# Altium footprint library my Library.PcbLib: 1247 footprints (part 44 of 78)
Each footprint in its own frame and in the unit in brackets; x right, y up, seen from the top. Pads: shape width x height; smd on the part's side, far side on the other; paste and mask are expansions set on the pad; w line width, h text height; cw(c..) or ccw(c..) is an arc to the next point about the centre after c.
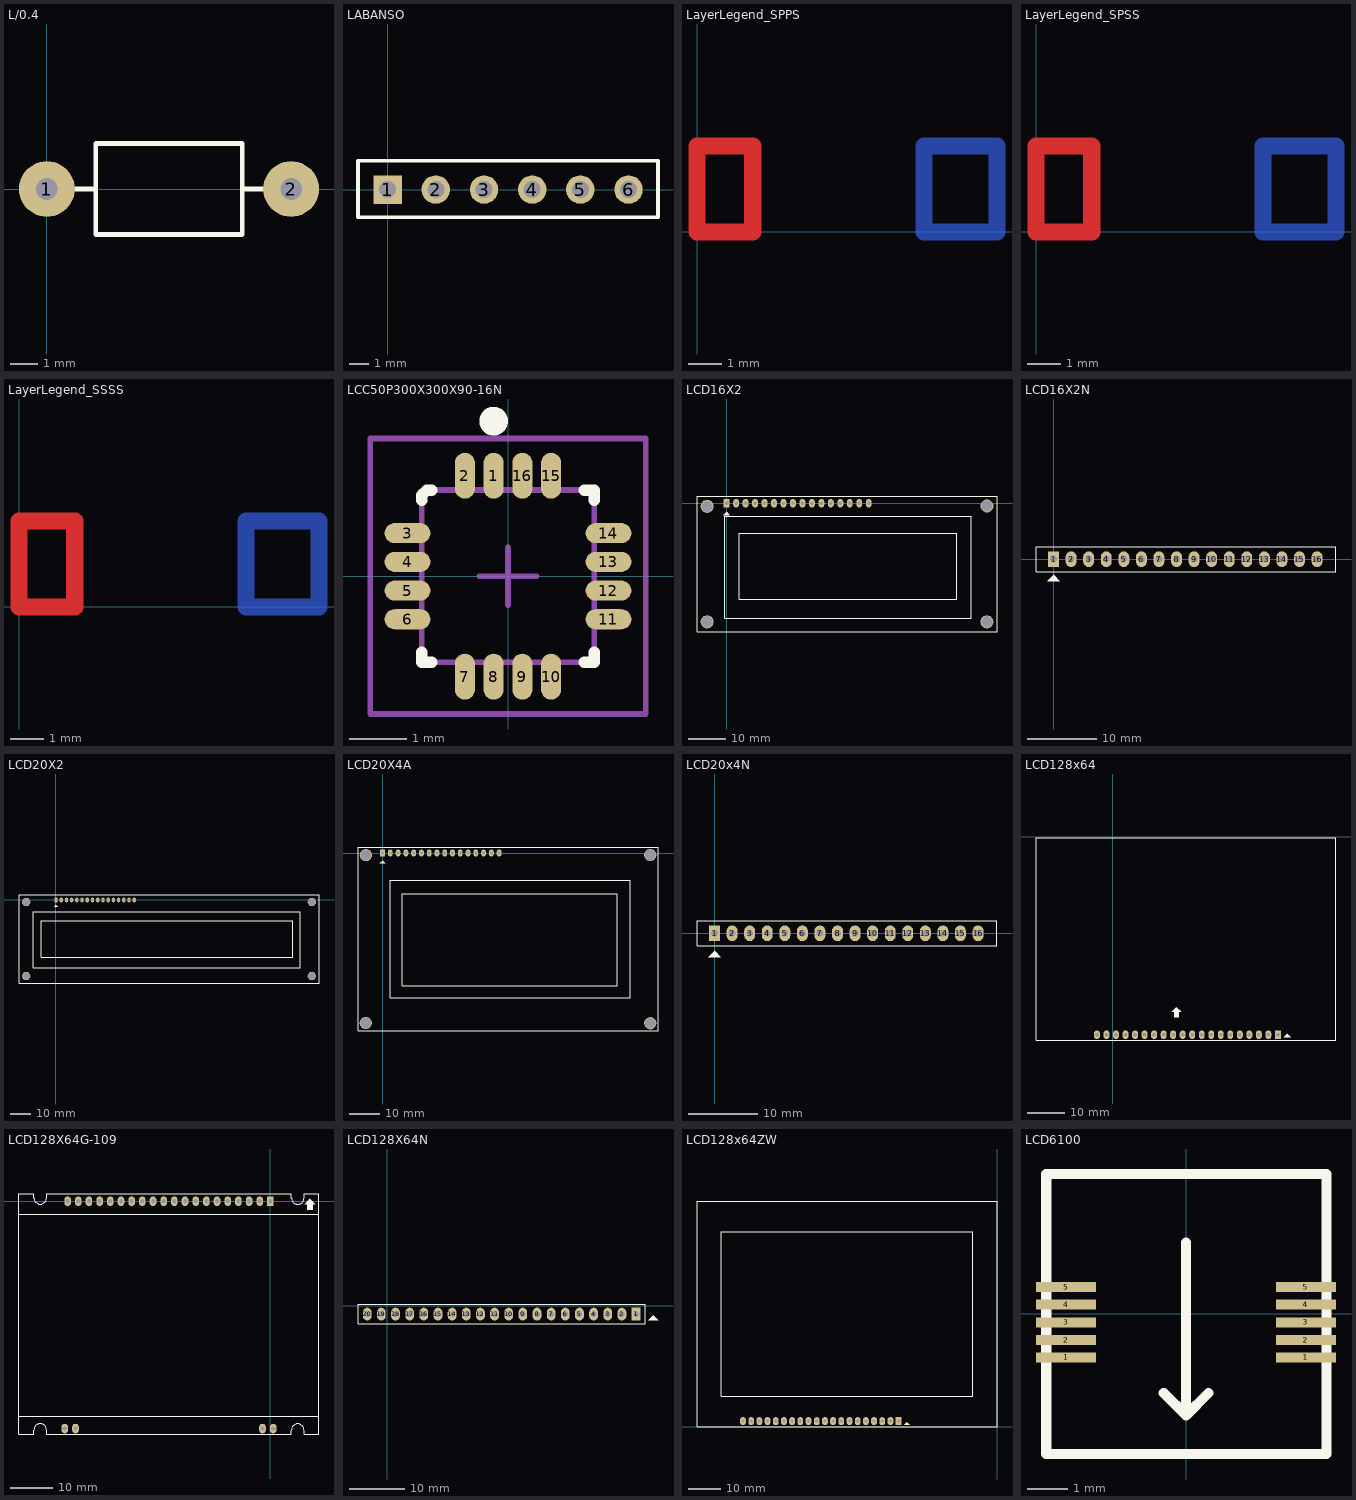
[diagram p43: the footprints below, top view; thin cyan lines are the x and y axes]

## L/0.4 [mil] "Inductor , 2 Pin, L 350mil, W 150 mil"
height 150
pads (2):
  round 80 hole 31: 1(0,0) 2(350,0)
Top Overlay:
  lines w7: 70,0 40,0 70,0 ; 70,0 70,-65 280,-65 280,0 ; 70,0 70,65 280,65 280,0 ; 280,0 310,0 280,0

## LABANSO [mm] "Connector; Header; 6 Position"
height 1.14
pads (6):
  rect 1.5x1.5 hole 0.9: 1(0,0)
  round 1.5 hole 0.9: 2(2.54,0) 3(5.08,0) 4(7.62,0) 5(10.16,0) 6(12.7,0)
Top Overlay:
  lines w0.2: -1.565,-1.455 -1.565,1.516 14.254,1.516 14.254,-1.455 -1.565,-1.455

## LayerLegend_SPPS [mm]
Top Layer:
  lines w0.508: 0,0 0,2.54 1.651,2.54 1.651,0 0,0
  text "1" at 0,0 h1.27
Mid-Layer 1:
  rectangle: 4.064,0.254 8.636,2.286
  rectangle: 0.254,0.254 1.905,2.286
  text "2" at 0,0 h1.27
Mid-Layer 2:
  rectangle: 6.477,0.254 8.636,2.286
  rectangle: 0.254,0.254 4.318,2.286
  text "3" at 0,0 h1.27
Bottom Layer:
  lines w0.508: 6.731,0 6.731,2.54 8.89,2.54 8.89,0 6.731,0
  text "4" at 0,0 h1.27

## LayerLegend_SPSS [mm]
Top Layer:
  lines w0.508: 0,0 1.651,0 1.651,2.54 0,2.54 0,0
  text "1" at 0,0 h1.27
Mid-Layer 1:
  rectangle: 0.254,0.254 1.905,2.286
  rectangle: 4.064,0.254 8.636,2.286
  text "2" at 0,0 h1.27
Mid-Layer 2:
  lines w0.508: 4.318,0 6.477,0 6.477,2.54 4.318,2.54 4.318,0
  text "3" at 0,0 h1.27
Bottom Layer:
  lines w0.508: 6.731,0 8.89,0 8.89,2.54 6.731,2.54 6.731,0
  text "4" at 0,0 h1.27

## LayerLegend_SSSS [mm]
Top Layer:
  lines w0.508: 0,0 1.651,0 1.651,2.54 0,2.54 0,0
  text "1" at 0,0 h1.27
Mid-Layer 1:
  lines w0.508: 1.905,0 4.064,0 4.064,2.54 1.905,2.54 1.905,0
  text "2" at 0,0 h1.27
Mid-Layer 2:
  lines w0.508: 4.318,0 6.477,0 6.477,2.54 4.318,2.54 4.318,0
  text "3" at 0,0 h1.27
Bottom Layer:
  lines w0.508: 6.731,0 8.89,0 8.89,2.54 6.731,2.54 6.731,0
  text "4" at 0,0 h1.27

## LCC50P300X300X90-16N [mm] "LCC, 16-Pins, Body 3.0x3.0mm (max), Pitch 0.50mm, IPC Medium Density"
height 0.9
pads (16):
  oval 0.35x0.8 smd: 1(-0.25,1.75) 2(-0.75,1.75) 7(-0.75,-1.75) 8(-0.25,-1.75) 9(0.25,-1.75) 10(0.75,-1.75) 15(0.75,1.75) 16(0.25,1.75)
  oval 0.8x0.35 smd: 3(-1.75,0.75) 4(-1.75,0.25) 5(-1.75,-0.25) 6(-1.75,-0.75) 11(1.75,-0.75) 12(1.75,-0.25) 13(1.75,0.25) 14(1.75,0.75)
Top Overlay:
  circle w0.25: c-0.25,2.7 r0.125
  lines w0.2: -1.5,-1.325 -1.5,-1.5 -1.325,-1.5 ; -1.5,1.325 -1.5,1.412 -1.412,1.5 -1.325,1.5 ; 1.325,-1.5 1.5,-1.5 1.5,-1.325 ; 1.325,1.5 1.5,1.5 1.5,1.325
Mechanical 13:
  lines w0.1: -1.5,-1.5 1.5,-1.5 1.5,1.5 -1.412,1.5 -1.5,1.412 -1.5,-1.5
Mechanical 15:
  lines w0.1: -0.5,0 0.5,0 ; 0,-0.5 0,0.5 ; -2.4,-2.4 2.4,-2.4 2.4,2.4 -2.4,2.4 -2.4,-2.4
3D body: height 0.9, standoff 0, extent -1.5,-1.5 1.5,1.5

## LCD16X2 [mil] "LCD dipslay 16x2, 16 pin"
height 400
pads (20):
  rect 62x90 hole 36: 1(0,0)
  oval 62x90 hole 36: 2(100,0) 3(200,0) 4(300,0) 5(400,0) 6(500,0) 7(600,0) 8(700,0) 9(800,0) 10(900,0) 11(1000,0) 12(1100,0) 13(1200,0) 14(1300,0) 15(1400,0) 16(1500,0)
  round 137.8 hole 118.11: "Hole 0"(-206,-1252) "Hole 0"(-206,-33) "Hole 0"(2747,-1252) "Hole 0"(2748,-29)
Top Overlay:
  region: 0,-90 -35,-125 35,-125
  lines w7: -313,-1359 -313,76 2854,76 2854,-1359 -313,-1359 ; -19,-1215 -19,-140 2581,-140 2581,-1215 -19,-1215 ; 131,-1015 131,-315 2431,-315 2431,-1015 131,-1015
3D body "female_header_a-bl254-eg-g16d.stp": height 440.94, standoff -19.69, extent -56.12,-45.03 1553.72,53.4
3D body "LCD module 16 X 2 backlight.STEP": height 728.96, standoff 208.96, extent -314.65,-1360 2854.65,77.01

## LCD16X2N [mil] "LCD dipslay 16x2, 16 pin"
height 400
pads (16):
  rect 62x90 hole 39: 1(0,0)
  oval 62x90 hole 39: 2(100,0) 3(200,0) 4(300,0) 5(400,0) 6(500,0) 7(600,0) 8(700,0) 9(800,0) 10(900,0) 11(1000,0) 12(1100,0) 13(1200,0) 14(1300,0) 15(1400,0) 16(1500,0)
Top Overlay:
  region: 0,-90 -35,-125 35,-125
  lines w7: -100,-71 -100,70 1608,70 1608,-71 -100,-71
3D body "socket16.stp": height 276.19, standoff -117.51, extent -49,-49 1551,51
3D body "jp16.stp": height 468.11, standoff -20.08, extent -48.03,-48.43 1548.03,50
3D body "lcd16.STEP": height 764, standoff 244, extent -319.64,-1353.49 2849.65,83.51

## LCD20X2 [mil] "LCD dipslay 20x2, 16 pin"
height 400
pads (20):
  rect 62x90 hole 36: 1(0,0)
  oval 62x90 hole 36: 2(100,0) 3(200,0) 4(300,0) 5(400,0) 6(500,0) 7(600,0) 8(700,0) 9(800,0) 10(900,0) 11(1000,0) 12(1100,0) 13(1200,0) 14(1300,0) 15(1400,0) 16(1500,0)
  round 157.48 hole 137.8: "Hole 0"(-570.87,-1456.69) "Hole 0"(-570.87,-39.37) "Hole 0"(4901.57,-1456.69) "Hole 0"(4901.57,-39.37)
Top Overlay:
  region: 0,-90 -35,-125 35,-125
  lines w7: -708.66,-1594.49 -708.66,100 5039.37,100 5039.37,-1594.49 -708.66,-1594.49 ; -436,-1300 -436,-225 4682,-225 4682,-1300 -436,-1300 ; -286,-1100 -286,-400 4532,-400 4532,-1100 -286,-1100
3D body "SW3dPS-Display20x2.STEP": height 198, standoff -180, extent -100,-1437 4470,33

## LCD20X4A [mil] "LCD dipslay 20x4, 16 pin"
height 400
pads (20):
  rect 62x90 hole 39: 1(0,0)
  oval 62x90 hole 39: 2(100,0) 3(200,0) 4(300,0) 5(400,0) 6(500,0) 7(600,0) 8(700,0) 9(800,0) 10(900,0) 11(1000,0) 12(1100,0) 13(1200,0) 14(1300,0) 15(1400,0) 16(1500,0)
  round 157.48 hole 137.8: "Hole 0"(-216,-2188) "Hole 0"(-215,-27) "Hole 0"(3445,-2190) "Hole 0"(3445,-25)
Top Overlay:
  region: 0,-100 -35,-135 35,-135
  lines w7: -316,-2287 -316,74 3544,74 3544,-2287 -316,-2287 ; 102,-1863 102,-348 3189,-348 3189,-1863 102,-1863 ; 252,-1706 252,-523 3018,-523 3018,-1706 252,-1706
3D body "User Library-Sparkfun20x4LCD-1.STEP": height 413.39, standoff 0, extent -314.27,-2288.21 3544,74

## LCD20x4N [mil] "LCD dipslay 20x4, 16 pin"
height 400
pads (16):
  rect 62x90 hole 39: 1(0,0)
  oval 62x90 hole 39: 2(100,0) 3(200,0) 4(300,0) 5(400,0) 6(500,0) 7(600,0) 8(700,0) 9(800,0) 10(900,0) 11(1000,0) 12(1100,0) 13(1200,0) 14(1300,0) 15(1400,0) 16(1500,0)
Top Overlay:
  region: 0,-100 -35,-135 35,-135
  lines w7: -100,-71 -100,70 1608,70 1608,-71 -100,-71
3D body "User Library-LCD20_4.STEP": height 417.32, standoff -125.98, extent -392,-2265.2 3466.27,97

## LCD128x64 [mil] "LCD Graphic 128x64, 20 pin"
height 400
pads (20):
  rect 62x90 hole 39: 1(1735,-2080)
  oval 62x90 hole 39: 2(1635,-2080) 3(1535,-2080) 4(1435,-2080) 5(1335,-2080) 6(1235,-2080) 7(1135,-2080) 8(1035,-2080) 9(935,-2080) 10(835,-2080) 11(735,-2080) 12(635,-2080) 13(535,-2080) 14(435,-2080) 15(335,-2080) 16(235,-2080) 17(135,-2080) 18(35,-2080) 19(-65,-2080) 20(-165,-2080)
Top Overlay:
  region: 670,-1790 620,-1840 645,-1840 645,-1895 695,-1895 695,-1840 720,-1840
  region: 1832.5,-2072.5 1797.5,-2107.5 1867.5,-2107.5
  lines w8: -805,-2138 2345,-2138 2345,-12 -805,-12 -805,-2138
3D body "User Library-GRAPHIC LCD WG12864B.STEP": height 275.59, standoff -330.71, extent -804.61,-2137.98 2345,-12

## LCD128X64G-109 [mil] "LCD Graphic 128x64, 20 pin"
height 400
pads (24):
  oval 62x90 hole 39.37: 0(-1925.87,-2129.13) 0(-1825.87,-2129.13) 0(-74.13,-2129.13) 0(25.87,-2129.13) 2(-100,0) 3(-200,0) 4(-300,0) 5(-400,0) 6(-500,0) 7(-600,0) 8(-700,0) 9(-800,0) 10(-900,0) 11(-1000,0) 12(-1100,0) 13(-1200,0) 14(-1300,0) 15(-1400,0) 16(-1500,0) 17(-1600,0) 18(-1700,0) 19(-1800,0) 20(-1900,0)
  rect 62x90 hole 39.37: 1(0,0)
Top Overlay:
  region: 370,23.37 320,-26.63 345,-26.63 345,-81.63 395,-81.63 395,-26.63 420,-26.63
  lines w8: -2355,-2014.13 450,-2014.13 ; -2355,-124.13 450,-124.13 ; -2215,-2184.13 -2355,-2184.13 -2355,70.87 -2215,70.87 ; -2215,-2183.13 -2215,-2143.13 cw(c-2155.94,-2143.13) -2096.89,-2143.13 ; -2215,29.87 -2215,69.87 ; -2215,31.87 ccw(c-2155.94,31.87) -2096.89,31.87 ; -2097,-2143.13 -2097,-2183.13 -2095,-2183.13 ; -2097,29.87 -2097,69.87 -2095,69.87 ; -2095,-2184.13 195,-2184.13 197,-2184.13 197,-2144.13 ; -2095,70.87 195,70.87 ; 195,68.87 197,68.87 197,28.87 ; 196.89,-2144.13 cw(c255.94,-2144.13) 315,-2144.13 315,-2184.13 455,-2184.13 455,70.87 315,70.87 ; 196.89,30.87 ccw(c255.94,30.87) 315,30.87 ; 315,28.87 315,68.87
3D body: height 98.43, standoff 39.37, extent -2355,-2185 455,70
3D body: height 196.85, standoff 98.43, extent -2350,-2015 450,-125

## LCD128X64N [mil] "LCD Graphic 128x64, 20 pin"
height 400
pads (20):
  rect 62x90 hole 39: 1(1760,-60)
  oval 62x90 hole 39: 2(1660,-60) 3(1560,-60) 4(1460,-60) 5(1360,-60) 6(1260,-60) 7(1160,-60) 8(1060,-60) 9(960,-60) 10(860,-60) 11(760,-60) 12(660,-60) 13(560,-60) 14(460,-60) 15(360,-60) 16(260,-60) 17(160,-60) 18(60,-60) 19(-40,-60) 20(-140,-60)
Top Overlay:
  region: 1880,-70 1845,-105 1915,-105
  lines w7: -205,-130 -205,11 1825,11 1825,-130 -205,-130

## LCD128x64ZW [mm] "LCD Graphic 128x64, 20 pin"
height 10.16
pads (20):
  rect 1.8x2.5 hole 1: 1(-30.505,1.803)
  oval 1.8x2.5 hole 1: 2(-33.045,1.803) 3(-35.585,1.803) 4(-38.125,1.803) 5(-40.665,1.803) 6(-43.205,1.803) 7(-45.745,1.803) 8(-48.285,1.803) 9(-50.825,1.803) 10(-53.365,1.803) 11(-55.905,1.803) 12(-58.445,1.803) 13(-60.985,1.803) 14(-63.525,1.803) 15(-66.065,1.803) 16(-68.605,1.803) 17(-71.145,1.803) 18(-73.685,1.803) 19(-76.225,1.803) 20(-78.765,1.803)
Top Overlay:
  region: -27.953,1.486 -28.842,0.597 -27.064,0.597
  lines w0.203: -93.015,0 -93.015,70 -0.015,70 -0.015,0 -93.015,0 ; -85.522,9.5 -7.518,9.5 -7.518,60.503 -85.522,60.503 -85.522,9.5
3D body "User Library-GRAPHIC LCD WG12864B.STEP": height 7, standoff -8.4, extent -86.502,7.95 -6.502,61.95

## LCD6100 [mm]
pads (10):
  rect 1.5x0.25 smd: 1(-3,-1.091) 1(2.994,-1.091) 2(-3,-0.66) 2(2.994,-0.66) 3(-3,-0.215) 3(2.994,-0.215) 4(-3,0.229) 4(2.994,0.229) 5(-3,0.661) 5(2.994,0.661)
Top Overlay:
  lines w0.254: -0.559,-1.981 0,-2.54 ; 0,1.778 0,-2.54 ; 0.559,-1.981 0,-2.54 ; -3.493,-3.507 -3.493,3.493 3.507,3.493 3.507,-3.507 -3.493,-3.507